# Altium integrated library GPDSE.IntLib: 634 symbols (part 5 of 7)
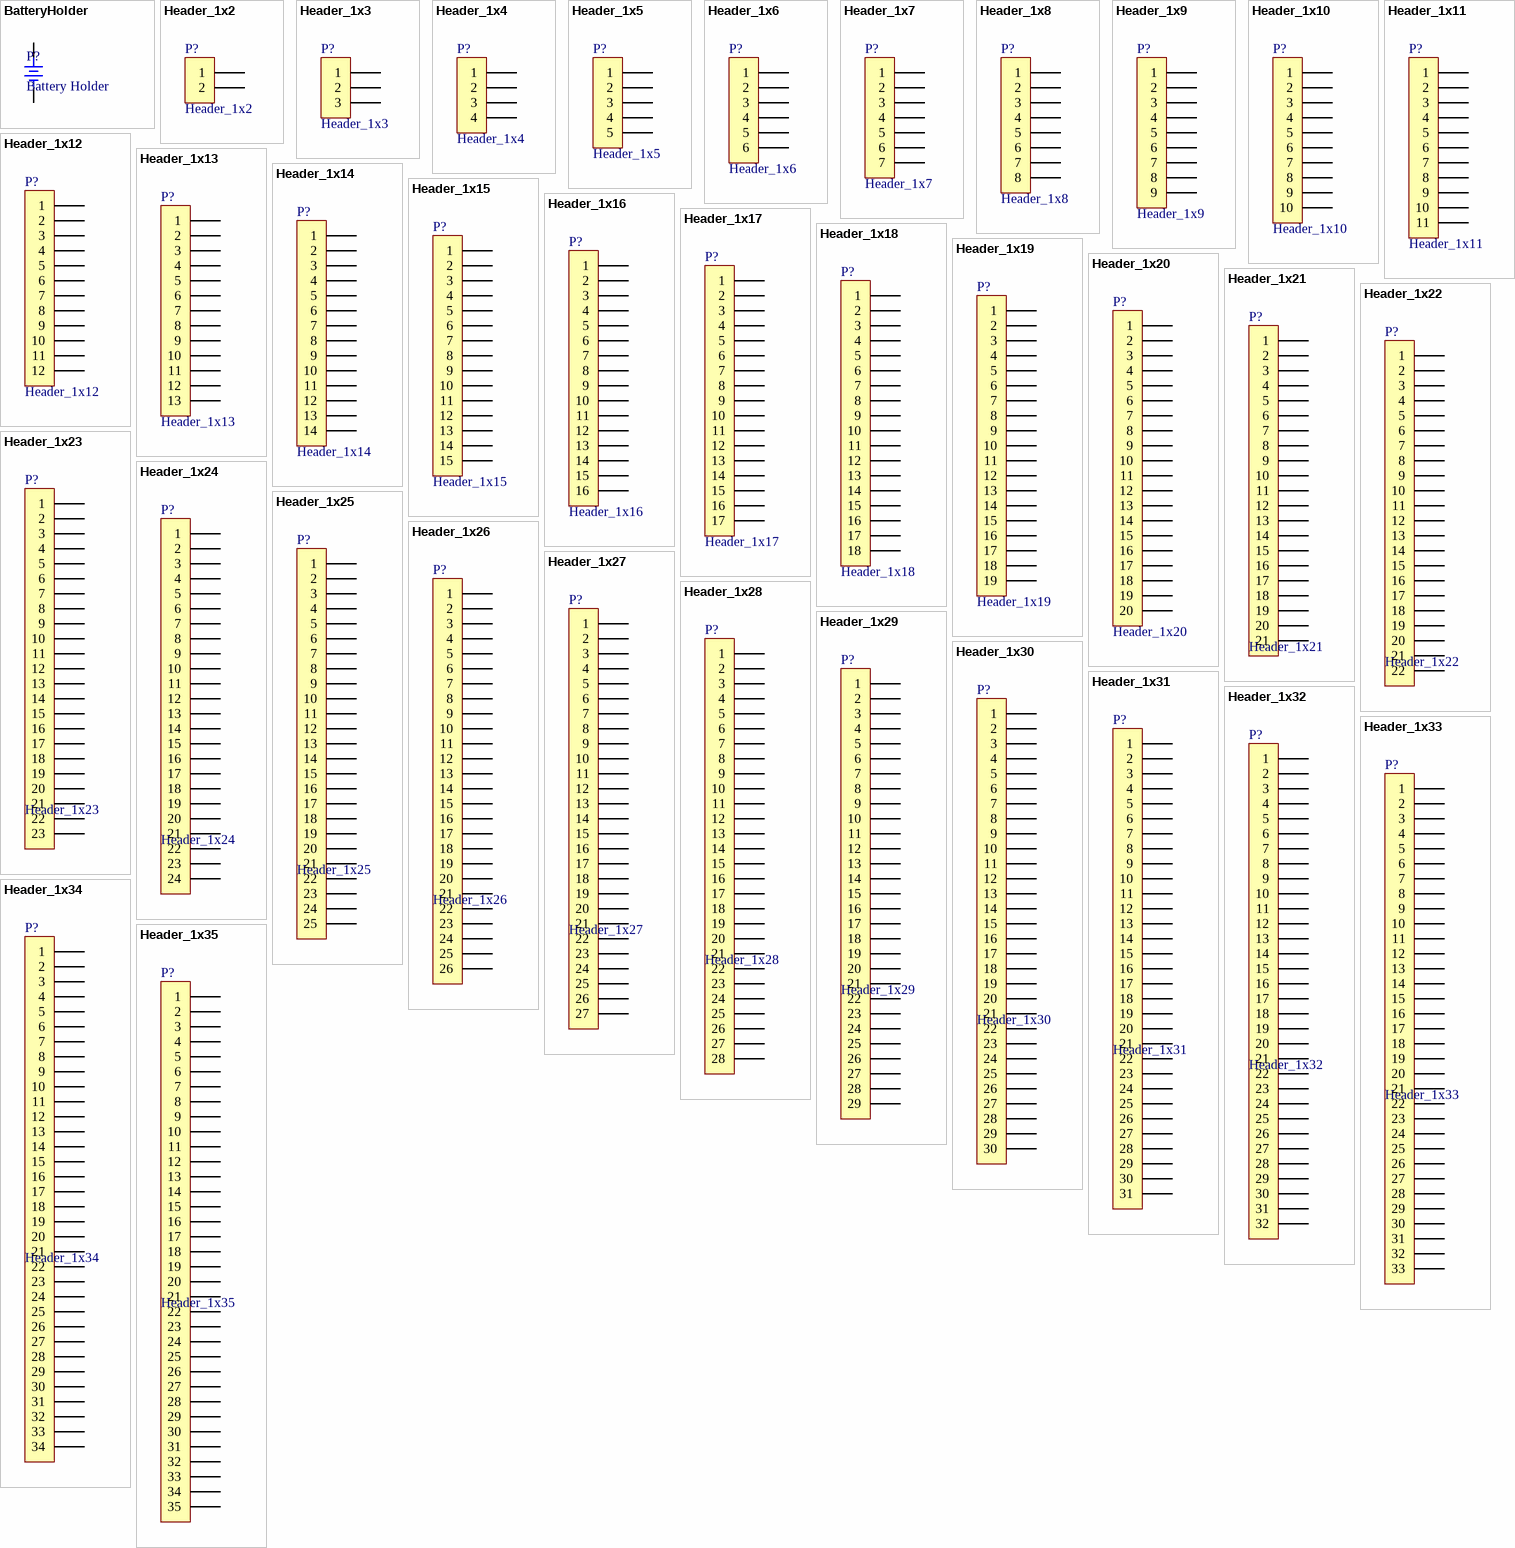
[diagram p39: symbols BatteryHolder to Header_1x35]

## Header_1x23
designator P?
Header, 1 Line, 23 Columns, 23 Pins; LatestRevisionDate: 17-Jul-2002; LatestRevisionNote: Re-released for DXP Platform.; Publisher: Altium Limited
footprint HDR-M-1x23-2.54mm-180-9.2mm (Male Header, 1 line, 23 columns, 180 degrees, 9.2 mm length, 3D ASSMANN WSW components)
footprint HDR-M-1x23-2.54mm-180-11.2mm (Male Header, 1 line, 23 columns, 180 degrees, 11.2 mm length, 3D ASSMANN WSW components)
footprint HDR-M-1x23-2.54mm-180-11.6mm (Male Header, 1 line, 23 columns, 180 degrees, 11.6 mm length, 3D ASSMANN WSW components)
footprint HDR-M-1x23-2.54mm-180-12.4mm (Male Header, 1 line, 23 columns, 180 degrees, 12.4 mm length, 3D ASSMANN WSW components)
footprint HDR-M-1x23-2.54mm-180-13.6mm (Male Header, 1 line, 23 columns, 180 degrees, 13.6 mm length, 3D ASSMANN WSW components)
footprint HDR-M-1x23-2.54mm-180-21.1mm (Male Header, 1 line, 23 columns, 180 degrees, 21.1 mm length, 3D ASSMANN WSW components)
footprint HDR-F-1x23-2.54mm-180-8.7mm (Female Header, 1 line, 23 columns, 180 degrees, 8.7 mm length, 3D ASSMANN WSW components)
footprint HDR-M-1x23-2.54mm-90-15.0mm (Male Header, 1 line, 23 columns, 90 degrees, 15.0 mm length, 3D ASSMANN WSW components)
pins: 1, 2, 3, 4, 5, 6, 7, 8, 9, 10, 11, 12, 13, 14, 15, 16, 17, 18, 19, 20, 21, 22, 23

## Header_1x24
designator P?
Header, 1 Line, 24 Columns, 24 Pins; LatestRevisionDate: 17-Jul-2002; LatestRevisionNote: Re-released for DXP Platform.; Publisher: Altium Limited
footprint HDR-M-1x24-2.54mm-180-9.2mm (Male Header, 1 line, 24 columns, 180 degrees, 9.2 mm length, 3D ASSMANN WSW components)
footprint HDR-M-1x24-2.54mm-180-11.2mm (Male Header, 1 line, 24 columns, 180 degrees, 11.2 mm length, 3D ASSMANN WSW components)
footprint HDR-M-1x24-2.54mm-180-11.6mm (Male Header, 1 line, 24 columns, 180 degrees, 11.6 mm length, 3D ASSMANN WSW components)
footprint HDR-M-1x24-2.54mm-180-12.4mm (Male Header, 1 line, 24 columns, 180 degrees, 12.4 mm length, 3D ASSMANN WSW components)
footprint HDR-M-1x24-2.54mm-180-13.6mm (Male Header, 1 line, 24 columns, 180 degrees, 13.6 mm length, 3D ASSMANN WSW components)
footprint HDR-M-1x24-2.54mm-180-21.1mm (Male Header, 1 line, 24 columns, 180 degrees, 21.1 mm length, 3D ASSMANN WSW components)
footprint HDR-F-1x24-2.54mm-180-8.7mm (Female Header, 1 line, 24 columns, 180 degrees, 8.7 mm length, 3D ASSMANN WSW components)
footprint HDR-M-1x24-2.54mm-90-15.0mm (Male Header, 1 line, 24 columns, 90 degrees, 15.0 mm length, 3D ASSMANN WSW components)
pins: 1, 2, 3, 4, 5, 6, 7, 8, 9, 10, 11, 12, 13, 14, 15, 16, 17, 18, 19, 20, 21, 22, 23, 24

## Header_1x25
designator P?
Header, 1 Line, 25 Columns, 25 Pins; LatestRevisionDate: 17-Jul-2002; LatestRevisionNote: Re-released for DXP Platform.; Publisher: Altium Limited
footprint HDR-M-1x25-2.54mm-180-9.2mm (Male Header, 1 line, 25 columns, 180 degrees, 9.2 mm length, 3D ASSMANN WSW components)
footprint HDR-M-1x25-2.54mm-180-11.2mm (Male Header, 1 line, 25 columns, 180 degrees, 11.2 mm length, 3D ASSMANN WSW components)
footprint HDR-M-1x25-2.54mm-180-11.6mm (Male Header, 1 line, 25 columns, 180 degrees, 11.6 mm length, 3D ASSMANN WSW components)
footprint HDR-M-1x25-2.54mm-180-12.4mm (Male Header, 1 line, 25 columns, 180 degrees, 12.4 mm length, 3D ASSMANN WSW components)
footprint HDR-M-1x25-2.54mm-180-13.6mm (Male Header, 1 line, 25 columns, 180 degrees, 13.6 mm length, 3D ASSMANN WSW components)
footprint HDR-M-1x25-2.54mm-180-21.1mm (Male Header, 1 line, 25 columns, 180 degrees, 21.1 mm length, 3D ASSMANN WSW components)
footprint HDR-F-1x25-2.54mm-180-8.7mm (Female Header, 1 line, 25 columns, 180 degrees, 8.7 mm length, 3D ASSMANN WSW components)
footprint HDR-M-1x25-2.54mm-90-15.0mm (Male Header, 1 line, 25 columns, 90 degrees, 15.0 mm length, 3D ASSMANN WSW components)
pins: 1, 2, 3, 4, 5, 6, 7, 8, 9, 10, 11, 12, 13, 14, 15, 16, 17, 18, 19, 20, 21, 22, 23, 24, 25

## Header_1x26
designator P?
Header, 1 Line, 26 Columns, 26 Pins; LatestRevisionDate: 17-Jul-2002; LatestRevisionNote: Re-released for DXP Platform.; Publisher: Altium Limited
footprint HDR-M-1x26-2.54mm-180-9.2mm (Male Header, 1 line, 26 columns, 180 degrees, 9.2 mm length, 3D ASSMANN WSW components)
footprint HDR-M-1x26-2.54mm-180-11.2mm (Male Header, 1 line, 26 columns, 180 degrees, 11.2 mm length, 3D ASSMANN WSW components)
footprint HDR-M-1x26-2.54mm-180-11.6mm (Male Header, 1 line, 26 columns, 180 degrees, 11.6 mm length, 3D ASSMANN WSW components)
footprint HDR-M-1x26-2.54mm-180-12.4mm (Male Header, 1 line, 26 columns, 180 degrees, 12.4 mm length, 3D ASSMANN WSW components)
footprint HDR-M-1x26-2.54mm-180-13.6mm (Male Header, 1 line, 26 columns, 180 degrees, 13.6 mm length, 3D ASSMANN WSW components)
footprint HDR-M-1x26-2.54mm-180-21.1mm (Male Header, 1 line, 26 columns, 180 degrees, 21.1 mm length, 3D ASSMANN WSW components)
footprint HDR-F-1x26-2.54mm-180-8.7mm (Female Header, 1 line, 26 columns, 180 degrees, 8.7 mm length, 3D ASSMANN WSW components)
footprint HDR-M-1x26-2.54mm-90-15.0mm (Male Header, 1 line, 26 columns, 90 degrees, 15.0 mm length, 3D ASSMANN WSW components)
pins: 1, 2, 3, 4, 5, 6, 7, 8, 9, 10, 11, 12, 13, 14, 15, 16, 17, 18, 19, 20, 21, 22, 23, 24, 25, 26

## Header_1x27
designator P?
Header, 1 Line, 27 Columns, 27 Pins; LatestRevisionDate: 17-Jul-2002; LatestRevisionNote: Re-released for DXP Platform.; Publisher: Altium Limited
footprint HDR-M-1x27-2.54mm-180-9.2mm (Male Header, 1 line, 27 columns, 180 degrees, 9.2 mm length, 3D ASSMANN WSW components)
footprint HDR-M-1x27-2.54mm-180-11.2mm (Male Header, 1 line, 27 columns, 180 degrees, 11.2 mm length, 3D ASSMANN WSW components)
footprint HDR-M-1x27-2.54mm-180-11.6mm (Male Header, 1 line, 27 columns, 180 degrees, 11.6 mm length, 3D ASSMANN WSW components)
footprint HDR-M-1x27-2.54mm-180-12.4mm (Male Header, 1 line, 27 columns, 180 degrees, 12.4 mm length, 3D ASSMANN WSW components)
footprint HDR-M-1x27-2.54mm-180-13.6mm (Male Header, 1 line, 27 columns, 180 degrees, 13.6 mm length, 3D ASSMANN WSW components)
footprint HDR-M-1x27-2.54mm-180-21.1mm (Male Header, 1 line, 27 columns, 180 degrees, 21.1 mm length, 3D ASSMANN WSW components)
footprint HDR-F-1x27-2.54mm-180-8.7mm (Female Header, 1 line, 27 columns, 180 degrees, 8.7 mm length, 3D ASSMANN WSW components)
footprint HDR-M-1x27-2.54mm-90-15.0mm (Male Header, 1 line, 27 columns, 90 degrees, 15.0 mm length, 3D ASSMANN WSW components)
pins: 1, 2, 3, 4, 5, 6, 7, 8, 9, 10, 11, 12, 13, 14, 15, 16, 17, 18, 19, 20, 21, 22, 23, 24, 25, 26, 27

## Header_1x28
designator P?
Header, 1 Line, 28 Columns, 28 Pins; LatestRevisionDate: 17-Jul-2002; LatestRevisionNote: Re-released for DXP Platform.; Publisher: Altium Limited
footprint HDR-M-1x28-2.54mm-180-9.2mm (Male Header, 1 line, 28 columns, 180 degrees, 9.2 mm length, 3D ASSMANN WSW components)
footprint HDR-M-1x28-2.54mm-180-11.2mm (Male Header, 1 line, 28 columns, 180 degrees, 11.2 mm length, 3D ASSMANN WSW components)
footprint HDR-M-1x28-2.54mm-180-11.6mm (Male Header, 1 line, 28 columns, 180 degrees, 11.6 mm length, 3D ASSMANN WSW components)
footprint HDR-M-1x28-2.54mm-180-12.4mm (Male Header, 1 line, 28 columns, 180 degrees, 12.4 mm length, 3D ASSMANN WSW components)
footprint HDR-M-1x28-2.54mm-180-13.6mm (Male Header, 1 line, 28 columns, 180 degrees, 13.6 mm length, 3D ASSMANN WSW components)
footprint HDR-M-1x28-2.54mm-180-21.1mm (Male Header, 1 line, 28 columns, 180 degrees, 21.1 mm length, 3D ASSMANN WSW components)
footprint HDR-F-1x28-2.54mm-180-8.7mm (Female Header, 1 line, 28 columns, 180 degrees, 8.7 mm length, 3D ASSMANN WSW components)
footprint HDR-M-1x28-2.54mm-90-15.0mm (Male Header, 1 line, 28 columns, 90 degrees, 15.0 mm length, 3D ASSMANN WSW components)
pins: 1, 2, 3, 4, 5, 6, 7, 8, 9, 10, 11, 12, 13, 14, 15, 16, 17, 18, 19, 20, 21, 22, 23, 24, 25, 26, 27, 28

## Header_1x29
designator P?
Header, 1 Line, 29 Columns, 29 Pins; LatestRevisionDate: 17-Jul-2002; LatestRevisionNote: Re-released for DXP Platform.; Publisher: Altium Limited
footprint HDR-M-1x29-2.54mm-180-9.2mm (Male Header, 1 line, 29 columns, 180 degrees, 9.2 mm length, 3D ASSMANN WSW components)
footprint HDR-M-1x29-2.54mm-180-11.2mm (Male Header, 1 line, 29 columns, 180 degrees, 11.2 mm length, 3D ASSMANN WSW components)
footprint HDR-M-1x29-2.54mm-180-11.6mm (Male Header, 1 line, 29 columns, 180 degrees, 11.6 mm length, 3D ASSMANN WSW components)
footprint HDR-M-1x29-2.54mm-180-12.4mm (Male Header, 1 line, 29 columns, 180 degrees, 12.4 mm length, 3D ASSMANN WSW components)
footprint HDR-M-1x29-2.54mm-180-13.6mm (Male Header, 1 line, 29 columns, 180 degrees, 13.6 mm length, 3D ASSMANN WSW components)
footprint HDR-M-1x29-2.54mm-180-21.1mm (Male Header, 1 line, 29 columns, 180 degrees, 21.1 mm length, 3D ASSMANN WSW components)
footprint HDR-F-1x29-2.54mm-180-8.7mm (Female Header, 1 line, 29 columns, 180 degrees, 8.7 mm length, 3D ASSMANN WSW components)
footprint HDR-M-1x29-2.54mm-90-15.0mm (Male Header, 1 line, 29 columns, 90 degrees, 15.0 mm length, 3D ASSMANN WSW components)
pins: 1, 2, 3, 4, 5, 6, 7, 8, 9, 10, 11, 12, 13, 14, 15, 16, 17, 18, 19, 20, 21, 22, 23, 24, 25, 26, 27, 28, 29

## Header_1x30
designator P?
Header, 1 Line, 30 Columns, 30 Pins; LatestRevisionDate: 17-Jul-2002; LatestRevisionNote: Re-released for DXP Platform.; Publisher: Altium Limited
footprint HDR-M-1x30-2.54mm-180-9.2mm (Male Header, 1 line, 30 columns, 180 degrees, 9.2 mm length, 3D ASSMANN WSW components)
footprint HDR-M-1x30-2.54mm-180-11.2mm (Male Header, 1 line, 30 columns, 180 degrees, 11.2 mm length, 3D ASSMANN WSW components)
footprint HDR-M-1x30-2.54mm-180-11.6mm (Male Header, 1 line, 30 columns, 180 degrees, 11.6 mm length, 3D ASSMANN WSW components)
footprint HDR-M-1x30-2.54mm-180-12.4mm (Male Header, 1 line, 30 columns, 180 degrees, 12.4 mm length, 3D ASSMANN WSW components)
footprint HDR-M-1x30-2.54mm-180-13.6mm (Male Header, 1 line, 30 columns, 180 degrees, 13.6 mm length, 3D ASSMANN WSW components)
footprint HDR-M-1x30-2.54mm-180-21.1mm (Male Header, 1 line, 30 columns, 180 degrees, 21.1 mm length, 3D ASSMANN WSW components)
footprint HDR-F-1x30-2.54mm-180-8.7mm (Female Header, 1 line, 30 columns, 180 degrees, 8.7 mm length, 3D ASSMANN WSW components)
footprint HDR-M-1x30-2.54mm-90-15.0mm (Male Header, 1 line, 30 columns, 90 degrees, 15.0 mm length, 3D ASSMANN WSW components)
pins: 1, 2, 3, 4, 5, 6, 7, 8, 9, 10, 11, 12, 13, 14, 15, 16, 17, 18, 19, 20, 21, 22, 23, 24, 25, 26, 27, 28, 29, 30

## Header_1x31
designator P?
Header, 1 Line, 31 Columns, 31 Pins; LatestRevisionDate: 17-Jul-2002; LatestRevisionNote: Re-released for DXP Platform.; Publisher: Altium Limited
footprint HDR-M-1x31-2.54mm-180-9.2mm (Male Header, 1 line, 31 columns, 180 degrees, 9.2 mm length, 3D ASSMANN WSW components)
footprint HDR-M-1x31-2.54mm-180-11.2mm (Male Header, 1 line, 31 columns, 180 degrees, 11.2 mm length, 3D ASSMANN WSW components)
footprint HDR-M-1x31-2.54mm-180-11.6mm (Male Header, 1 line, 31 columns, 180 degrees, 11.6 mm length, 3D ASSMANN WSW components)
footprint HDR-M-1x31-2.54mm-180-12.4mm (Male Header, 1 line, 31 columns, 180 degrees, 12.4 mm length, 3D ASSMANN WSW components)
footprint HDR-M-1x31-2.54mm-180-13.6mm (Male Header, 1 line, 31 columns, 180 degrees, 13.6 mm length, 3D ASSMANN WSW components)
footprint HDR-M-1x31-2.54mm-180-21.1mm (Male Header, 1 line, 31 columns, 180 degrees, 21.1 mm length, 3D ASSMANN WSW components)
footprint HDR-F-1x31-2.54mm-180-8.7mm (Female Header, 1 line, 31 columns, 180 degrees, 8.7 mm length, 3D ASSMANN WSW components)
footprint HDR-M-1x31-2.54mm-90-15.0mm (Male Header, 1 line, 31 columns, 90 degrees, 15.0 mm length, 3D ASSMANN WSW components)
pins: 1, 2, 3, 4, 5, 6, 7, 8, 9, 10, 11, 12, 13, 14, 15, 16, 17, 18, 19, 20, 21, 22, 23, 24, 25, 26, 27, 28, 29, 30, 31

## Header_1x32
designator P?
Header, 1 Line, 32 Columns, 32 Pins; LatestRevisionDate: 17-Jul-2002; LatestRevisionNote: Re-released for DXP Platform.; Publisher: Altium Limited
footprint HDR-M-1x32-2.54mm-180-9.2mm (Male Header, 1 line, 32 columns, 180 degrees, 9.2 mm length, 3D ASSMANN WSW components)
footprint HDR-M-1x32-2.54mm-180-11.2mm (Male Header, 1 line, 32 columns, 180 degrees, 11.2 mm length, 3D ASSMANN WSW components)
footprint HDR-M-1x32-2.54mm-180-11.6mm (Male Header, 1 line, 32 columns, 180 degrees, 11.6 mm length, 3D ASSMANN WSW components)
footprint HDR-M-1x32-2.54mm-180-12.4mm (Male Header, 1 line, 32 columns, 180 degrees, 12.4 mm length, 3D ASSMANN WSW components)
footprint HDR-M-1x32-2.54mm-180-13.6mm (Male Header, 1 line, 32 columns, 180 degrees, 13.6 mm length, 3D ASSMANN WSW components)
footprint HDR-M-1x32-2.54mm-180-21.1mm (Male Header, 1 line, 32 columns, 180 degrees, 21.1 mm length, 3D ASSMANN WSW components)
footprint HDR-F-1x32-2.54mm-180-8.7mm (Female Header, 1 line, 32 columns, 180 degrees, 8.7 mm length, 3D ASSMANN WSW components)
footprint HDR-M-1x32-2.54mm-90-15.0mm (Male Header, 1 line, 32 columns, 90 degrees, 15.0 mm length, 3D ASSMANN WSW components)
pins: 1, 2, 3, 4, 5, 6, 7, 8, 9, 10, 11, 12, 13, 14, 15, 16, 17, 18, 19, 20, 21, 22, 23, 24, 25, 26, 27, 28, 29, 30, 31, 32

## Header_1x33
designator P?
Header, 1 Line, 33 Columns, 33 Pins; LatestRevisionDate: 17-Jul-2002; LatestRevisionNote: Re-released for DXP Platform.; Publisher: Altium Limited
footprint HDR-M-1x33-2.54mm-180-9.2mm (Male Header, 1 line, 33 columns, 180 degrees, 9.2 mm length, 3D ASSMANN WSW components)
footprint HDR-M-1x33-2.54mm-180-11.2mm (Male Header, 1 line, 33 columns, 180 degrees, 11.2 mm length, 3D ASSMANN WSW components)
footprint HDR-M-1x33-2.54mm-180-11.6mm (Male Header, 1 line, 33 columns, 180 degrees, 11.6 mm length, 3D ASSMANN WSW components)
footprint HDR-M-1x33-2.54mm-180-12.4mm (Male Header, 1 line, 33 columns, 180 degrees, 12.4 mm length, 3D ASSMANN WSW components)
footprint HDR-M-1x33-2.54mm-180-13.6mm (Male Header, 1 line, 33 columns, 180 degrees, 13.6 mm length, 3D ASSMANN WSW components)
footprint HDR-M-1x33-2.54mm-180-21.1mm (Male Header, 1 line, 33 columns, 180 degrees, 21.1 mm length, 3D ASSMANN WSW components)
footprint HDR-F-1x33-2.54mm-180-8.7mm (Female Header, 1 line, 33 columns, 180 degrees, 8.7 mm length, 3D ASSMANN WSW components)
footprint HDR-M-1x33-2.54mm-90-15.0mm (Male Header, 1 line, 33 columns, 90 degrees, 15.0 mm length, 3D ASSMANN WSW components)
pins: 1, 2, 3, 4, 5, 6, 7, 8, 9, 10, 11, 12, 13, 14, 15, 16, 17, 18, 19, 20, 21, 22, 23, 24, 25, 26, 27, 28, 29, 30, 31, 32, 33

## Header_1x34
designator P?
Header, 1 Line, 34 Columns, 34 Pins; LatestRevisionDate: 17-Jul-2002; LatestRevisionNote: Re-released for DXP Platform.; Publisher: Altium Limited
footprint HDR-M-1x34-2.54mm-180-9.2mm (Male Header, 1 line, 34 columns, 180 degrees, 9.2 mm length, 3D ASSMANN WSW components)
footprint HDR-M-1x34-2.54mm-180-11.2mm (Male Header, 1 line, 34 columns, 180 degrees, 11.2 mm length, 3D ASSMANN WSW components)
footprint HDR-M-1x34-2.54mm-180-11.6mm (Male Header, 1 line, 34 columns, 180 degrees, 11.6 mm length, 3D ASSMANN WSW components)
footprint HDR-M-1x34-2.54mm-180-12.4mm (Male Header, 1 line, 34 columns, 180 degrees, 12.4 mm length, 3D ASSMANN WSW components)
footprint HDR-M-1x34-2.54mm-180-13.6mm (Male Header, 1 line, 34 columns, 180 degrees, 13.6 mm length, 3D ASSMANN WSW components)
footprint HDR-M-1x34-2.54mm-180-21.1mm (Male Header, 1 line, 34 columns, 180 degrees, 21.1 mm length, 3D ASSMANN WSW components)
footprint HDR-F-1x34-2.54mm-180-8.7mm (Female Header, 1 line, 34 columns, 180 degrees, 8.7 mm length, 3D ASSMANN WSW components)
footprint HDR-M-1x34-2.54mm-90-15.0mm (Male Header, 1 line, 34 columns, 90 degrees, 15.0 mm length, 3D ASSMANN WSW components)
pins: 1, 2, 3, 4, 5, 6, 7, 8, 9, 10, 11, 12, 13, 14, 15, 16, 17, 18, 19, 20, 21, 22, 23, 24, 25, 26, 27, 28, 29, 30, 31, 32, 33, 34

## Header_1x35
designator P?
Header, 1 Line, 35 Columns, 35 Pins; LatestRevisionDate: 17-Jul-2002; LatestRevisionNote: Re-released for DXP Platform.; Publisher: Altium Limited
footprint HDR-M-1x35-2.54mm-180-9.2mm (Male Header, 1 line, 35 columns, 180 degrees, 9.2 mm length, 3D ASSMANN WSW components)
footprint HDR-M-1x35-2.54mm-180-11.2mm (Male Header, 1 line, 35 columns, 180 degrees, 11.2 mm length, 3D ASSMANN WSW components)
footprint HDR-M-1x35-2.54mm-180-11.6mm (Male Header, 1 line, 35 columns, 180 degrees, 11.6 mm length, 3D ASSMANN WSW components)
footprint HDR-M-1x35-2.54mm-180-12.4mm (Male Header, 1 line, 35 columns, 180 degrees, 12.4 mm length, 3D ASSMANN WSW components)
footprint HDR-M-1x35-2.54mm-180-13.6mm (Male Header, 1 line, 35 columns, 180 degrees, 13.6 mm length, 3D ASSMANN WSW components)
footprint HDR-M-1x35-2.54mm-180-21.1mm (Male Header, 1 line, 35 columns, 180 degrees, 21.1 mm length, 3D ASSMANN WSW components)
footprint HDR-F-1x35-2.54mm-180-8.7mm (Female Header, 1 line, 35 columns, 180 degrees, 8.7 mm length, 3D ASSMANN WSW components)
footprint HDR-M-1x35-2.54mm-90-15.0mm (Male Header, 1 line, 35 columns, 90 degrees, 15.0 mm length, 3D ASSMANN WSW components)
pins: 1, 2, 3, 4, 5, 6, 7, 8, 9, 10, 11, 12, 13, 14, 15, 16, 17, 18, 19, 20, 21, 22, 23, 24, 25, 26, 27, 28, 29, 30, 31, 32, 33, 34, 35

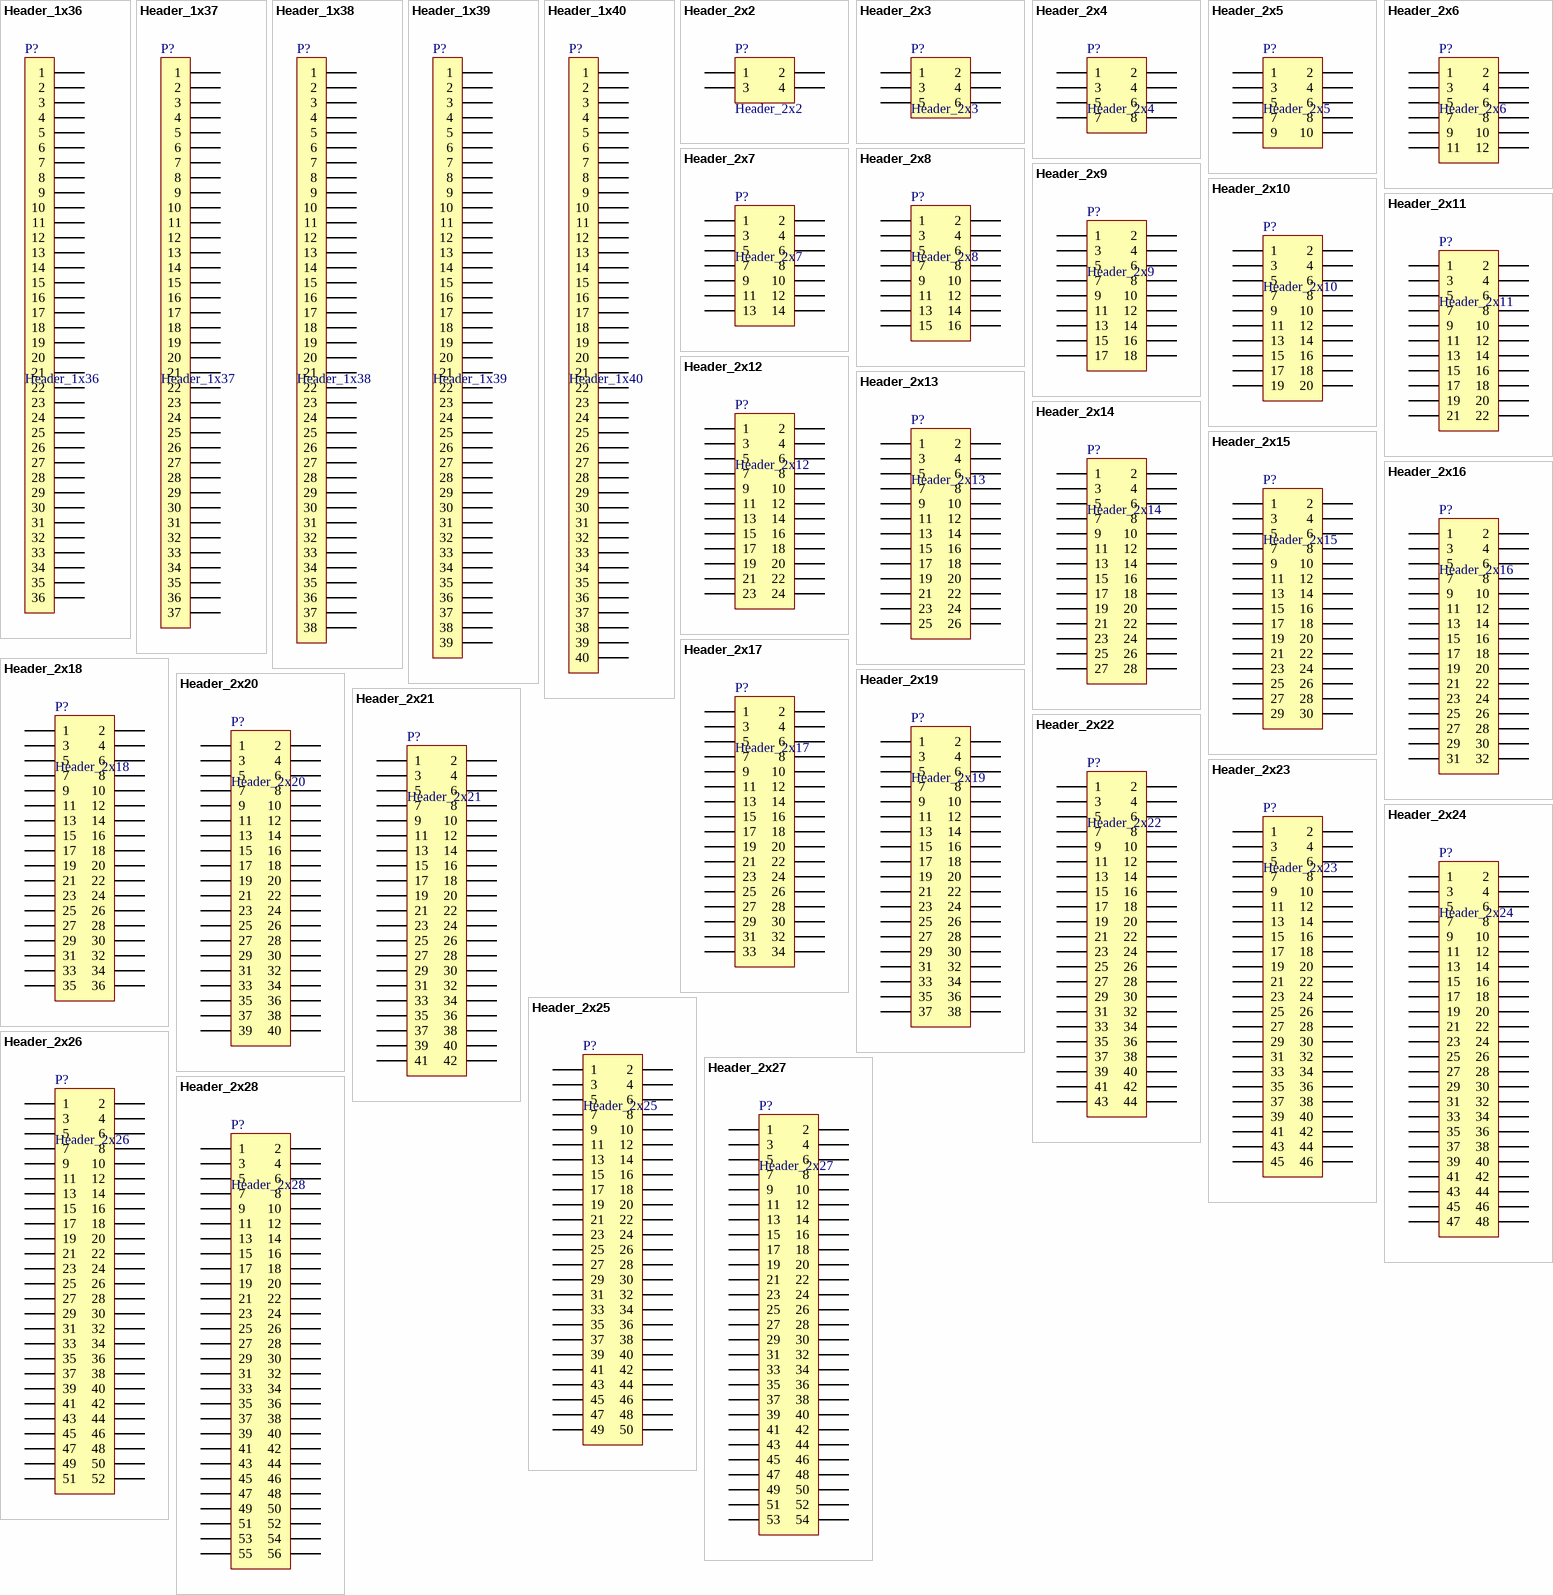
[diagram p21: symbols Header_1x36 to Header_2x28]

## Header_1x36
designator P?
Header, 1 Line, 36 Columns, 36 Pins; LatestRevisionDate: 17-Jul-2002; LatestRevisionNote: Re-released for DXP Platform.; Publisher: Altium Limited
footprint HDR-M-1x36-2.54mm-180-9.2mm (Male Header, 1 line, 36 columns, 180 degrees, 9.2 mm length, 3D ASSMANN WSW components)
footprint HDR-M-1x36-2.54mm-180-11.2mm (Male Header, 1 line, 36 columns, 180 degrees, 11.2 mm length, 3D ASSMANN WSW components)
footprint HDR-M-1x36-2.54mm-180-11.6mm (Male Header, 1 line, 36 columns, 180 degrees, 11.6 mm length, 3D ASSMANN WSW components)
footprint HDR-M-1x36-2.54mm-180-12.4mm (Male Header, 1 line, 36 columns, 180 degrees, 12.4 mm length, 3D ASSMANN WSW components)
footprint HDR-M-1x36-2.54mm-180-13.6mm (Male Header, 1 line, 36 columns, 180 degrees, 13.6 mm length, 3D ASSMANN WSW components)
footprint HDR-M-1x36-2.54mm-180-21.1mm (Male Header, 1 line, 36 columns, 180 degrees, 21.1 mm length, 3D ASSMANN WSW components)
footprint HDR-F-1x36-2.54mm-180-8.7mm (Female Header, 1 line, 36 columns, 180 degrees, 8.7 mm length, 3D ASSMANN WSW components)
footprint HDR-M-1x36-2.54mm-90-15.0mm (Male Header, 1 line, 36 columns, 90 degrees, 15.0 mm length, 3D ASSMANN WSW components)
pins: 1, 2, 3, 4, 5, 6, 7, 8, 9, 10, 11, 12, 13, 14, 15, 16, 17, 18, 19, 20, 21, 22, 23, 24, 25, 26, 27, 28, 29, 30, 31, 32, 33, 34, 35, 36

## Header_1x37
designator P?
Header, 1 Line, 37 Columns, 37 Pins; LatestRevisionDate: 17-Jul-2002; LatestRevisionNote: Re-released for DXP Platform.; Publisher: Altium Limited
footprint HDR-M-1x37-2.54mm-180-9.2mm (Male Header, 1 line, 37 columns, 180 degrees, 9.2 mm length, 3D ASSMANN WSW components)
footprint HDR-M-1x37-2.54mm-180-11.2mm (Male Header, 1 line, 37 columns, 180 degrees, 11.2 mm length, 3D ASSMANN WSW components)
footprint HDR-M-1x37-2.54mm-180-11.6mm (Male Header, 1 line, 37 columns, 180 degrees, 11.6 mm length, 3D ASSMANN WSW components)
footprint HDR-M-1x37-2.54mm-180-12.4mm (Male Header, 1 line, 37 columns, 180 degrees, 12.4 mm length, 3D ASSMANN WSW components)
footprint HDR-M-1x37-2.54mm-180-13.6mm (Male Header, 1 line, 37 columns, 180 degrees, 13.6 mm length, 3D ASSMANN WSW components)
footprint HDR-M-1x37-2.54mm-180-21.1mm (Male Header, 1 line, 37 columns, 180 degrees, 21.1 mm length, 3D ASSMANN WSW components)
footprint HDR-F-1x37-2.54mm-180-8.7mm (Female Header, 1 line, 37 columns, 180 degrees, 8.7 mm length, 3D ASSMANN WSW components)
footprint HDR-M-1x37-2.54mm-90-15.0mm (Male Header, 1 line, 37 columns, 90 degrees, 15.0 mm length, 3D ASSMANN WSW components)
pins: 1, 2, 3, 4, 5, 6, 7, 8, 9, 10, 11, 12, 13, 14, 15, 16, 17, 18, 19, 20, 21, 22, 23, 24, 25, 26, 27, 28, 29, 30, 31, 32, 33, 34, 35, 36, 37

## Header_1x38
designator P?
Header, 1 Line, 38 Columns, 38 Pins; LatestRevisionDate: 17-Jul-2002; LatestRevisionNote: Re-released for DXP Platform.; Publisher: Altium Limited
footprint HDR-M-1x38-2.54mm-180-9.2mm (Male Header, 1 line, 38 columns, 180 degrees, 9.2 mm length, 3D ASSMANN WSW components)
footprint HDR-M-1x38-2.54mm-180-11.2mm (Male Header, 1 line, 38 columns, 180 degrees, 11.2 mm length, 3D ASSMANN WSW components)
footprint HDR-M-1x38-2.54mm-180-11.6mm (Male Header, 1 line, 38 columns, 180 degrees, 11.6 mm length, 3D ASSMANN WSW components)
footprint HDR-M-1x38-2.54mm-180-12.4mm (Male Header, 1 line, 38 columns, 180 degrees, 12.4 mm length, 3D ASSMANN WSW components)
footprint HDR-M-1x38-2.54mm-180-13.6mm (Male Header, 1 line, 38 columns, 180 degrees, 13.6 mm length, 3D ASSMANN WSW components)
footprint HDR-M-1x38-2.54mm-180-21.1mm (Male Header, 1 line, 38 columns, 180 degrees, 21.1 mm length, 3D ASSMANN WSW components)
footprint HDR-F-1x38-2.54mm-180-8.7mm (Female Header, 1 line, 38 columns, 180 degrees, 8.7 mm length, 3D ASSMANN WSW components)
footprint HDR-M-1x38-2.54mm-90-15.0mm (Male Header, 1 line, 38 columns, 90 degrees, 15.0 mm length, 3D ASSMANN WSW components)
pins: 1, 2, 3, 4, 5, 6, 7, 8, 9, 10, 11, 12, 13, 14, 15, 16, 17, 18, 19, 20, 21, 22, 23, 24, 25, 26, 27, 28, 29, 30, 31, 32, 33, 34, 35, 36, 37, 38

## Header_1x39
designator P?
Header, 1 Line, 39 Columns, 39 Pins; LatestRevisionDate: 17-Jul-2002; LatestRevisionNote: Re-released for DXP Platform.; Publisher: Altium Limited
footprint HDR-M-1x39-2.54mm-180-9.2mm (Male Header, 1 line, 39 columns, 180 degrees, 9.2 mm length, 3D ASSMANN WSW components)
footprint HDR-M-1x39-2.54mm-180-11.2mm (Male Header, 1 line, 39 columns, 180 degrees, 11.2 mm length, 3D ASSMANN WSW components)
footprint HDR-M-1x39-2.54mm-180-11.6mm (Male Header, 1 line, 39 columns, 180 degrees, 11.6 mm length, 3D ASSMANN WSW components)
footprint HDR-M-1x39-2.54mm-180-12.4mm (Male Header, 1 line, 39 columns, 180 degrees, 12.4 mm length, 3D ASSMANN WSW components)
footprint HDR-M-1x39-2.54mm-180-13.6mm (Male Header, 1 line, 39 columns, 180 degrees, 13.6 mm length, 3D ASSMANN WSW components)
footprint HDR-M-1x39-2.54mm-180-21.1mm (Male Header, 1 line, 39 columns, 180 degrees, 21.1 mm length, 3D ASSMANN WSW components)
footprint HDR-F-1x39-2.54mm-180-8.7mm (Female Header, 1 line, 39 columns, 180 degrees, 8.7 mm length, 3D ASSMANN WSW components)
footprint HDR-M-1x39-2.54mm-90-15.0mm (Male Header, 1 line, 39 columns, 90 degrees, 15.0 mm length, 3D ASSMANN WSW components)
pins: 1, 2, 3, 4, 5, 6, 7, 8, 9, 10, 11, 12, 13, 14, 15, 16, 17, 18, 19, 20, 21, 22, 23, 24, 25, 26, 27, 28, 29, 30, 31, 32, 33, 34, 35, 36, 37, 38, 39

## Header_1x40
designator P?
Header, 1 Line, 40 Columns, 40 Pins; LatestRevisionDate: 17-Jul-2002; LatestRevisionNote: Re-released for DXP Platform.; Publisher: Altium Limited
footprint HDR-M-1x40-2.54mm-180-9.2mm (Male Header, 1 line, 40 columns, 180 degrees, 9.2 mm length, 3D ASSMANN WSW components)
footprint HDR-M-1x40-2.54mm-180-11.2mm (Male Header, 1 line, 40 columns, 180 degrees, 11.2 mm length, 3D ASSMANN WSW components)
footprint HDR-M-1x40-2.54mm-180-11.6mm (Male Header, 1 line, 40 columns, 180 degrees, 11.6 mm length, 3D ASSMANN WSW components)
footprint HDR-M-1x40-2.54mm-180-12.4mm (Male Header, 1 line, 40 columns, 180 degrees, 12.4 mm length, 3D ASSMANN WSW components)
footprint HDR-M-1x40-2.54mm-180-13.6mm (Male Header, 1 line, 40 columns, 180 degrees, 13.6 mm length, 3D ASSMANN WSW components)
footprint HDR-M-1x40-2.54mm-180-21.1mm (Male Header, 1 line, 40 columns, 180 degrees, 21.1 mm length, 3D ASSMANN WSW components)
footprint HDR-F-1x40-2.54mm-180-8.7mm (Female Header, 1 line, 40 columns, 180 degrees, 8.7 mm length, 3D ASSMANN WSW components)
footprint HDR-M-1x40-2.54mm-90-15.0mm (Male Header, 1 line, 40 columns, 90 degrees, 15.0 mm length, 3D ASSMANN WSW components)
pins: 1, 2, 3, 4, 5, 6, 7, 8, 9, 10, 11, 12, 13, 14, 15, 16, 17, 18, 19, 20, 21, 22, 23, 24, 25, 26, 27, 28, 29, 30, 31, 32, 33, 34, 35, 36, 37, 38, 39, 40

## Header_2x2
designator P?
Header, 2 Lines, 2 Columns, 4 Pins; LatestRevisionDate: 17-Jul-2002; LatestRevisionNote: Re-released for DXP Platform.; Publisher: Altium Limited
footprint HDR-F-2x2-1.27mm-SMD-4.57mm (Female Header, 2 lines, 2 columns, SMD, 4.57 mm length, 3D ASSMANN WSW components)
footprint HDR-M-2x2-2.54mm-180-9.2mm (Male Header, 2 lines, 2 columns, 180 degrees, 9.2 mm length)
footprint HDR-F-2x2-2.54mm-180-8.7mm (Female Header, 2 lines, 2 columns, 180 degrees, 8.7 mm length, 3D ASSMANN WSW components)
pins: 1, 2, 3, 4

## Header_2x3
designator P?
Header, 2 Lines, 3 Columns, 6 Pins; LatestRevisionDate: 17-Jul-2002; LatestRevisionNote: Re-released for DXP Platform.; Publisher: Altium Limited
footprint HDR-F-2x3-1.27mm-SMD-4.57mm (Female Header, 2 lines, 3 columns, SMD, 4.57 mm length, 3D ASSMANN WSW components)
footprint HDR-M-2x3-2.54mm-180-9.2mm (Male Header, 2 lines, 3 columns, 180 degrees, 9.2 mm length)
footprint HDR-F-2x3-2.54mm-180-8.7mm (Female Header, 2 lines, 3 columns, 180 degrees, 8.7 mm length, 3D ASSMANN WSW components)
pins: 1, 2, 3, 4, 5, 6

## Header_2x4
designator P?
Header, 2 Lines, 4 Columns, 8 Pins; LatestRevisionDate: 17-Jul-2002; LatestRevisionNote: Re-released for DXP Platform.; Publisher: Altium Limited
footprint HDR-F-2x4-1.27mm-SMD-4.57mm (Female Header, 2 lines, 4 columns, SMD, 4.57 mm length, 3D ASSMANN WSW components)
footprint HDR-M-2x4-2.54mm-180-9.2mm (Male Header, 2 lines, 4 columns, 180 degrees, 9.2 mm length)
footprint HDR-F-2x4-2.54mm-180-8.7mm (Female Header, 2 lines, 4 columns, 180 degrees, 8.7 mm length, 3D ASSMANN WSW components)
pins: 1, 2, 3, 4, 5, 6, 7, 8

## Header_2x5
designator P?
Header, 2 Lines, 5 Columns, 10 Pins; LatestRevisionDate: 17-Jul-2002; LatestRevisionNote: Re-released for DXP Platform.; Publisher: Altium Limited
footprint HDR-F-2x5-1.27mm-SMD-4.57mm (Female Header, 2 lines, 5 columns, SMD, 4.57 mm length, 3D ASSMANN WSW components)
footprint HDR-M-2x5-2.54mm-180-9.2mm (Male Header, 2 lines, 5 columns, 180 degrees, 9.2 mm length)
footprint HDR-F-2x5-2.54mm-180-8.7mm (Female Header, 2 lines, 5 columns, 180 degrees, 8.7 mm length, 3D ASSMANN WSW components)
pins: 1, 2, 3, 4, 5, 6, 7, 8, 9, 10
